# Altium footprint library IC.PcbLib: 220 footprints (part 9 of 14)
Each footprint in its own frame and in the unit in brackets; x right, y up, seen from the top. Pads: shape width x height; smd on the part's side, far side on the other; paste and mask are expansions set on the pad; w line width, h text height; cw(c..) or ccw(c..) is an arc to the next point about the centre after c.
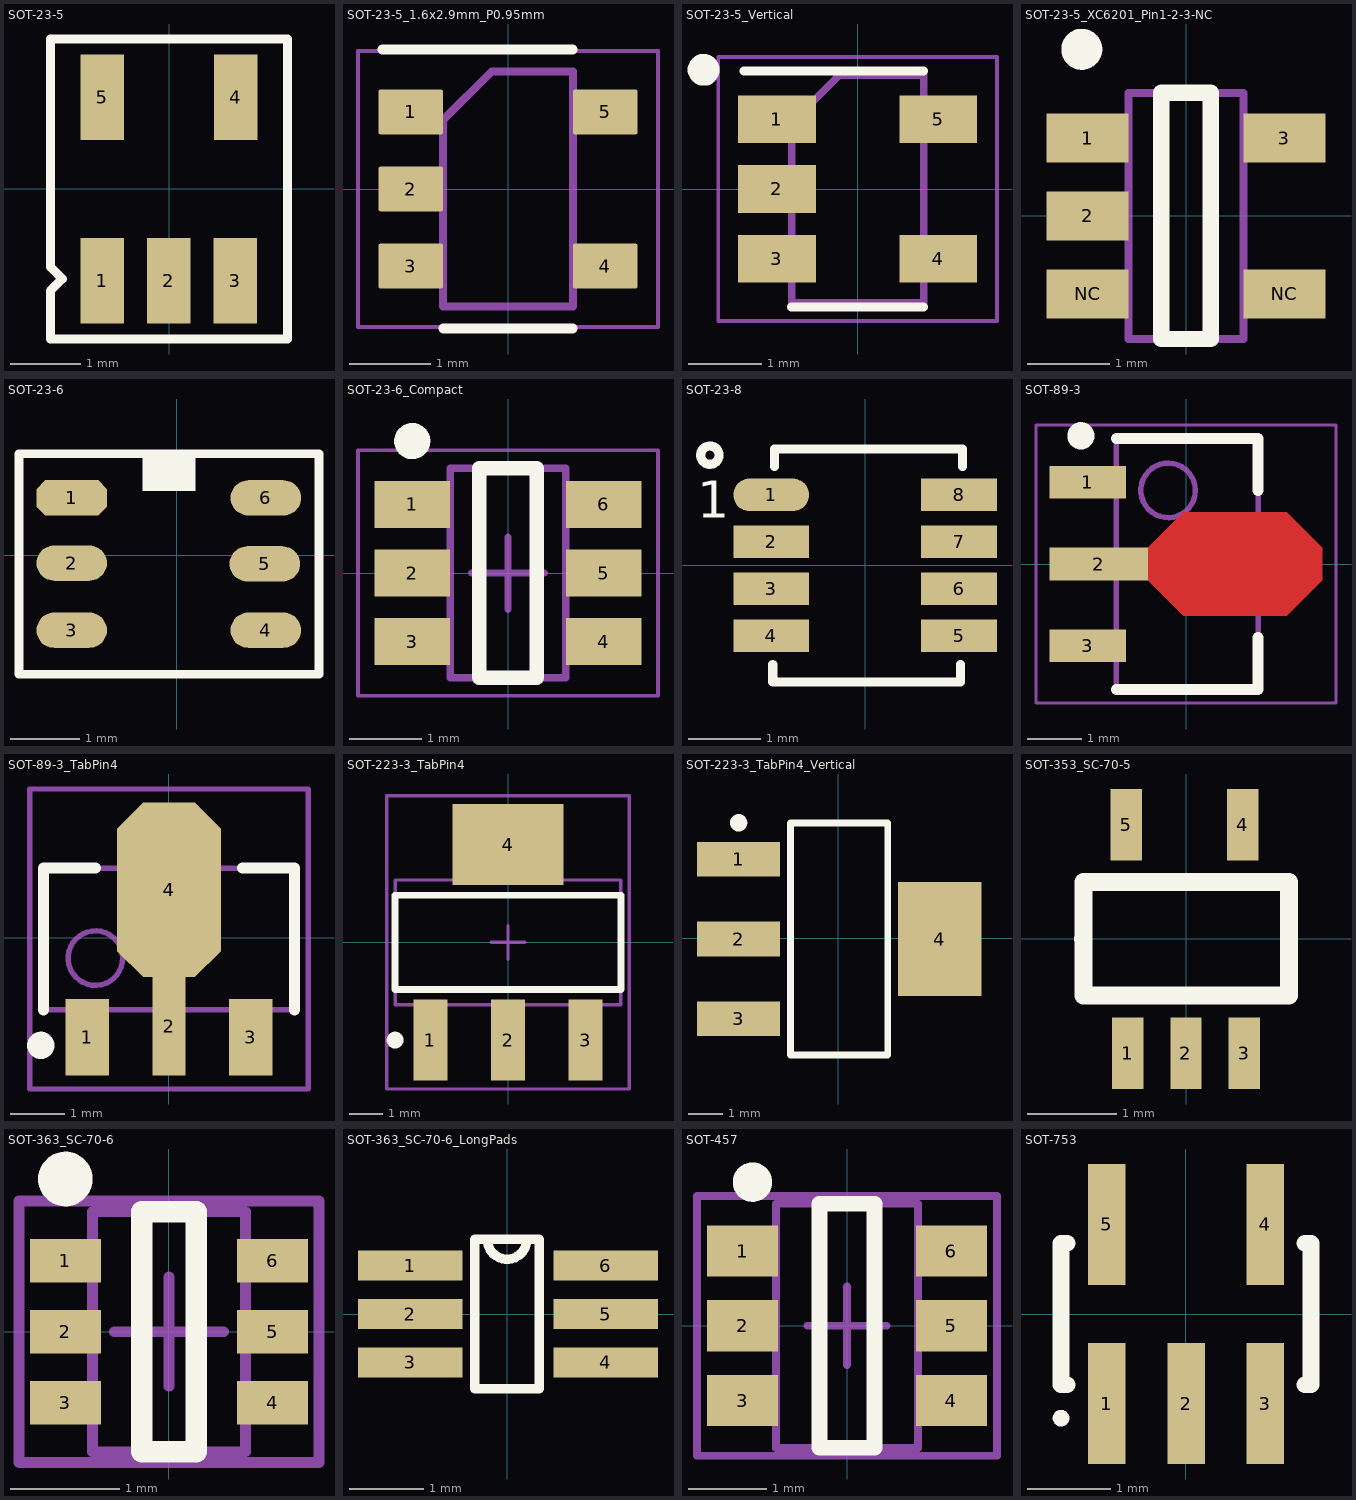
[diagram p8: the footprints below, top view; thin cyan lines are the x and y axes]

## SOT-23-5 [mm] "SOT-23-5 standard, pitch 0.95mm, pins 1-2-3 bottom, 4-5 top"
height 1.1
pads (5):
  rect 0.62x1.22 smd mask+0.076: 1(-0.953,-1.31) 2(-0.003,-1.31) 3(0.947,-1.31) 4(0.952,1.31) 5(-0.953,1.31)
Top Overlay:
  lines w0.127: -1.689,-2.138 -1.689,-1.452 -1.519,-1.281 -1.689,-1.111 -1.689,2.137 1.689,2.137 1.689,-2.138 -1.689,-2.138
3D body "User Library-SOT-23-5.STEP": height 1.41, standoff -0.05, extent -1.5,-1.5 1.5,1.5

## SOT-23-5_1.6x2.9mm_P0.95mm [mm] "5-lead IC package, 1.6 × 2.9 mm, 0.95 mm pitch — Vỏ IC 5 chân, thân 1.6 × 2.9 mm, bước chân 0.95 mm [Vo IC 5 chan, than 1.6 × 2.9 mm, buoc chan 0.95 mm]"
height 1.25
pads (5):
  rrect9% 0.8x0.55 smd: 1(-1.2,0.95) 2(-1.2,0) 3(-1.2,-0.95) 4(1.2,-0.95) 5(1.2,0.95)
Top Overlay:
  lines w0.12: -1.55,1.72 0.8,1.72 ; -0.8,-1.72 0.8,-1.72
  text ".Designator" at -0.8,1.9 h1
Mechanical 2:
  lines w0.1: -0.8,-1.45 0.8,-1.45 0.8,1.45 -0.2,1.45 -0.8,0.85 -0.8,-1.45
Mechanical 4:
  lines w0.05: -1.85,-1.7 1.85,-1.7 1.85,1.7 -1.85,1.7 -1.85,-1.7
3D body "SOT-23-5_1.6x2.9mm_P0.95mm.step": height 0, standoff 0, extent -1.6,-1.225 1.6,1.225

## SOT-23-5_Vertical [mm] "SOT-23-5 rotated 90deg, pitch 0.95mm, pins 1-2-3 left, 4-5 right"
height 1.1
pads (5):
  rect 1.06x0.65 smd: 1(-1.1,0.95) 2(-1.1,0) 3(-1.1,-0.95) 4(1.1,-0.95) 5(1.1,0.95)
Top Overlay:
  circle w0.254: c-2.1,1.625 r0.09
  lines w0.12: -1.55,1.61 0.9,1.61 ; -0.9,-1.61 0.9,-1.61
Mechanical 1:
  lines w0.05: -1.9,-1.8 1.9,-1.8 1.9,1.8 -1.9,1.8 -1.9,-1.8
Mechanical 15:
  lines w0.1: -0.9,-1.55 0.9,-1.55 0.9,1.55 -0.25,1.55 -0.9,0.9 -0.9,-1.55
3D body "SOT23-5.step": height 1.1, standoff 0, extent -1.25,-1.5 1.25,1.5

## SOT-23-5_XC6201_Pin1-2-3-NC [mm] "SOT-23-5 with pins 1, 2, 3, NC, NC (XC6201P332MR-G)"
height 1.1
pads (5):
  rect 1x0.6 smd: 1(-1.2,0.95) 2(-1.2,0) 3(1.2,0.95) NC(-1.2,-0.95) NC(1.2,-0.95)
Top Overlay:
  circle w0.25: c-1.27,2.032 r0.125
  lines w0.2: -0.3,-1.5 -0.3,1.5 0.3,1.5 0.3,-1.5 -0.3,-1.5
Mechanical 13:
  lines w0.1: -0.7,-1.5 0.7,-1.5 0.7,1.5 -0.7,1.5 -0.7,-1.5
3D body "CircuitWorks-SOT-23-5.STEP": height 1.06, standoff -0.04, extent -1.25,-1.5 1.25,1.5

## SOT-23-6 [mil] "SOT-23-6, pitch 0.95mm, span 2.79mm"
pads (6):
  oct 40x20 smd: 1(-59.41,32.4)
  oval 40x20 smd: 2(-59.41,-4.6) 3(-59.41,-42.6) 4(50.59,-42.6) 5(50,-5) 6(50.59,32.4)
Top Overlay:
  rectangle: -19.41,36.34 10.59,56.02
  lines w5: -89.29,43.42 -89.29,44.42 ; -89.29,47.42 -89.29,57.42 ; -75.29,57.42 -73.29,57.42 ; -74.29,57.42 -89.29,57.42 ; -89.29,57.42 -89.29,-67.58 80.71,-67.58 80.71,57.42 -89.29,57.42
3D body "User Library-SOT23-6.step": height 51.18, standoff 0, extent -64.05,-64.05 54.06,54.06

## SOT-23-6_Compact [mm] "SOT-23-6, pitch 0.95mm, span 2.65mm"
pads (6):
  rect 1.05x0.65 smd: 1(-1.325,0.95) 2(-1.325,0) 3(-1.325,-0.95) 4(1.325,-0.95) 5(1.325,0) 6(1.325,0.95)
Top Overlay:
  circle w0.25: c-1.325,1.825 r0.125
  lines w0.2: -0.4,-1.45 -0.4,1.45 0.4,1.45 0.4,-1.45 -0.4,-1.45
Mechanical 13:
  lines w0.1: -0.8,-1.45 0.8,-1.45 0.8,1.45 -0.8,1.45 -0.8,-1.45
Mechanical 15:
  lines w0.05: -2.075,-1.7 2.075,-1.7 2.075,1.7 -2.075,1.7 -2.075,-1.7
  lines w0.1: -0.5,0 0.5,0 ; 0,-0.5 0,0.5
3D body "SOT23-6.step": height 1.25, standoff 0, extent -1.422,-1.526 1.401,1.374

## SOT-23-8 [mm] "SOT-23-8, pitch 0.65mm, span 2.60mm"
height 1.45
pads (8):
  oval 1.05x0.45 smd mask+0.076: 1(-1.3,0.975)
  rect 1.05x0.45 smd mask+0.076: 2(-1.3,0.325) 3(-1.3,-0.325) 4(-1.3,-0.975) 5(1.3,-0.975) 6(1.3,-0.325) 7(1.3,0.325) 8(1.3,0.975)
Top Overlay:
  circle w0.127: c-2.149,1.524 r0.127
  lines w0.127: -1.279,-1.372 -1.279,-1.616 1.321,-1.616 1.321,-1.372 ; -1.254,1.366 -1.254,1.61 1.346,1.61 1.346,1.366
  text "1" at -2.327,0.66 h0.51
3D body "User Library-SOT-23-8-Thin.step": height 1.1, standoff 0, extent -1.454,-1.465 1.496,1.485

## SOT-89-3 [mm] "SOT-89 3-lead package, pitch 1.50mm"
height 1.5
pads (3):
  rect 1.4x0.6 smd: 1(-1.8,1.5) 3(-1.8,-1.5)
  rect 1.8x0.6 smd: 2(-1.6,0)
Top Layer:
  region: -0.7,0.3 -0.05,0.95 1.85,0.95 2.5,0.3 2.5,-0.3 1.85,-0.95 -0.05,-0.95 -0.7,-0.3
Top Overlay:
  circle w0.25: c-1.927,2.35 r0.125
  lines w0.2: -1.278,-2.3 1.322,-2.3 1.322,-1.35 ; -1.278,2.3 1.322,2.3 1.322,1.35
Mechanical 13:
  circle w0.1: c-0.327,1.35 r0.5
  lines w0.1: -1.278,-2.3 1.322,-2.3 1.322,2.3 -1.278,2.3 -1.278,-2.3
Mechanical 15:
  lines w0.05: -2.75,-2.55 2.75,-2.55 2.75,2.55 -2.75,2.55 -2.75,-2.55
  lines w0.1: -0.477,0 0.523,0 ; 0.022,-0.5 0.022,0.5
3D body "CircuitWorks-SOT89.step": height 1.5, standoff 0, extent -2.159,-2.25 1.841,2.25

## SOT-89-3_TabPin4 [mm] "SOT-89 3-lead + tab pin 4, pitch 1.50mm"
pads (4):
  rect 0.8x1.4 smd: 1(-1.5,-1.825) 3(1.5,-1.825)
  rect 0.6x1.8 smd: 2(0,-1.625)
  oct 1.9x3.2 smd: 4(0,0.875)
Top Overlay:
  circle w0.25: c-2.35,-1.975 r0.125
  lines w0.2: -2.3,-1.325 -2.3,1.275 -1.35,1.275 ; 1.35,1.275 2.3,1.275 2.3,-1.325
Mechanical 13:
  circle w0.1: c-1.35,-0.375 r0.5
  lines w0.1: -2.3,-1.325 2.3,-1.325 2.3,1.275 -2.3,1.275 -2.3,-1.325
Mechanical 15:
  lines w0.1: -0.5,-0.025 0.5,-0.025 ; 0,-0.525 0,0.475 ; -2.55,-2.775 2.55,-2.775 2.55,2.725 -2.55,2.725 -2.55,-2.775
3D body "sot89.step": height 1.4, standoff 0, extent -2.25,-2.21 2.25,1.725

## SOT-223-3_TabPin4 [mm] "SOT-223, 3 leads bottom + tab pin 4 top, pitch 2.30mm"
pads (4):
  rect 1x2.4 smd: 1(-2.3,-2.9) 2(0,-2.9) 3(2.3,-2.9)
  rect 3.3x2.4 smd: 4(0,2.9)
Top Overlay:
  circle w0.25: c-3.35,-2.9 r0.125
  lines w0.2: -3.35,-1.4 -3.35,1.4 3.35,1.4 3.35,-1.4 -3.35,-1.4
Mechanical 13:
  lines w0.1: -3.35,-1.85 -3.35,1.85 3.35,1.85 3.35,-1.85 -3.35,-1.85
Mechanical 15:
  lines w0.1: -0.5,0 0.5,0 ; 0,-0.5 0,0.5 ; -3.6,-4.35 -3.6,4.35 3.6,4.35 3.6,-4.35 -3.6,-4.35
3D body "SW3DPS-SOT-223-DEFAULT.step": height 1.68, standoff 0, extent -3.25,-3.556 3.25,3.404

## SOT-223-3_TabPin4_Vertical [mm] "SOT-223 rotated 90deg, 3 leads left + tab pin 4 right, pitch 2.30mm"
height 1.8
pads (4):
  rect 2.4x1 smd: 1(-2.875,2.275) 2(-2.875,-0.025) 3(-2.875,-2.325)
  rect 2.4x3.3 smd: 4(2.925,-0.025)
Top Overlay:
  circle w0.25: c-2.875,3.325 r0.125
  lines w0.2: -1.375,-3.375 -1.375,3.325 1.425,3.325 1.425,-3.375 -1.375,-3.375
3D body "User Library-SOT223-3.step": height 1.7, standoff 0, extent -3.729,-3.275 3.271,3.225

## SOT-353_SC-70-5 [mm] "SOT-353 / SC-88A / SC-70-5, 5 pins, pitch 0.65mm"
height 1.1
pads (5):
  rect 0.35x0.8 smd: 1(-0.65,-1.276) 2(0,-1.276) 3(0.65,-1.276) 4(0.635,1.27) 5(-0.665,1.27)
Top Overlay:
  lines w0.2: -1.15,0 -1.143,0 -1.143,-0.635 1.15,-0.635 1.15,0.127 1.15,0.635 -1.143,0.635 -1.143,-0.254
3D body "User Library-SOT353-1.step": height 1.1, standoff 0, extent -1.1,-1.2 1.1,1.2

## SOT-363_SC-70-6 [mm] "SOT-363 / SC-88 / SC-70-6, 6 pins, pitch 0.65mm, span 1.90mm"
height 1.1
pads (6):
  rect 0.65x0.4 smd: 1(-0.95,0.65) 2(-0.95,0) 3(-0.95,-0.65) 4(0.95,-0.65) 5(0.95,0) 6(0.95,0.65)
Top Overlay:
  circle w0.25: c-0.95,1.4 r0.125
  lines w0.2: -0.25,-1.1 -0.25,1.1 0.25,1.1 0.25,-1.1 -0.25,-1.1
Mechanical 13:
  lines w0.1: -0.7,-1.1 0.7,-1.1 0.7,1.1 -0.7,1.1 -0.7,-1.1
Mechanical 15:
  lines w0.1: -0.5,0 0.5,0 ; 0,-0.5 0,0.5 ; -1.375,-1.2 1.375,-1.2 1.375,1.2 -1.375,1.2 -1.375,-1.2
3D body "User Library-SOT363-2.step": height 1.1, standoff 0, extent -1.2,-1.1 1.2,1.1

## SOT-363_SC-70-6_LongPads [mm] "SOT-363 / SC-70-6, 6 pins, pitch 0.65mm, span 2.63mm"
height 1.1
pads (6):
  rect 1.4x0.4 smd mask+0.076: 1(-1.3,0.65) 2(-1.3,0) 3(-1.3,-0.65) 4(1.325,-0.65) 5(1.325,0) 6(1.325,0.65)
Top Overlay:
  lines w0.127: -0.265,1 ccw(c0,1) 0.265,1 ; -0.432,-1 0.432,-1 0.432,1 -0.432,1 -0.432,-1
3D body "74AUP2G3404GW,125.stp": height 1.1, standoff 0, extent -1.05,-1 1.05,1

## SOT-457 [mm] "SOT-457 / SC-74 6-pin package, pitch 0.95mm"
height 1.1
pads (6):
  rect 0.9x0.65 smd: 1(-1.327,0.95) 2(-1.327,0) 3(-1.327,-0.95) 4(1.327,-0.95) 5(1.327,0) 6(1.327,0.95)
Top Overlay:
  circle w0.25: c-1.2,1.825 r0.125
  lines w0.2: -0.35,-1.55 -0.35,1.55 0.35,1.55 0.35,-1.55 -0.35,-1.55
Mechanical 13:
  lines w0.1: -0.9,-1.55 0.9,-1.55 0.9,1.55 -0.9,1.55 -0.9,-1.55
Mechanical 15:
  lines w0.1: -0.5,0 0.5,0 ; 0,-0.5 0,0.5 ; -1.905,-1.65 1.905,-1.65 1.905,1.65 -1.905,1.65 -1.905,-1.65
3D body "User Library-SOT23-6.step": height 1.3, standoff 0, extent -1.5,-1.5 1.5,1.5

## SOT-753 [mm] "SOT-753 / SC-74A 5-pin package, pitch 0.95mm"
height 1.1
pads (5):
  rect 0.45x1.45 smd: 1(-0.95,-1.075) 2(0,-1.075) 3(0.95,-1.075) 4(0.95,1.075) 5(-0.95,1.075)
Top Overlay:
  circle w0.1: c-1.5,-1.25 r0.05
  lines w0.2: -1.425,-0.85 -1.5,-0.85 -1.5,0.85 -1.425,0.85 ; 1.425,-0.85 1.5,-0.85 1.5,0.85 1.425,0.85
3D body "User Library-SOT753.step": height 1.1, standoff 0, extent -1.55,-1.5 1.55,1.5